# Altium footprint library ref-packages.PCBLIB: 1543 footprints (part 64 of 103)
Each footprint in its own frame and in the unit in brackets; x right, y up, seen from the top. Pads: shape width x height; smd on the part's side, far side on the other; paste and mask are expansions set on the pad; w line width, h text height; cw(c..) or ccw(c..) is an arc to the next point about the centre after c.
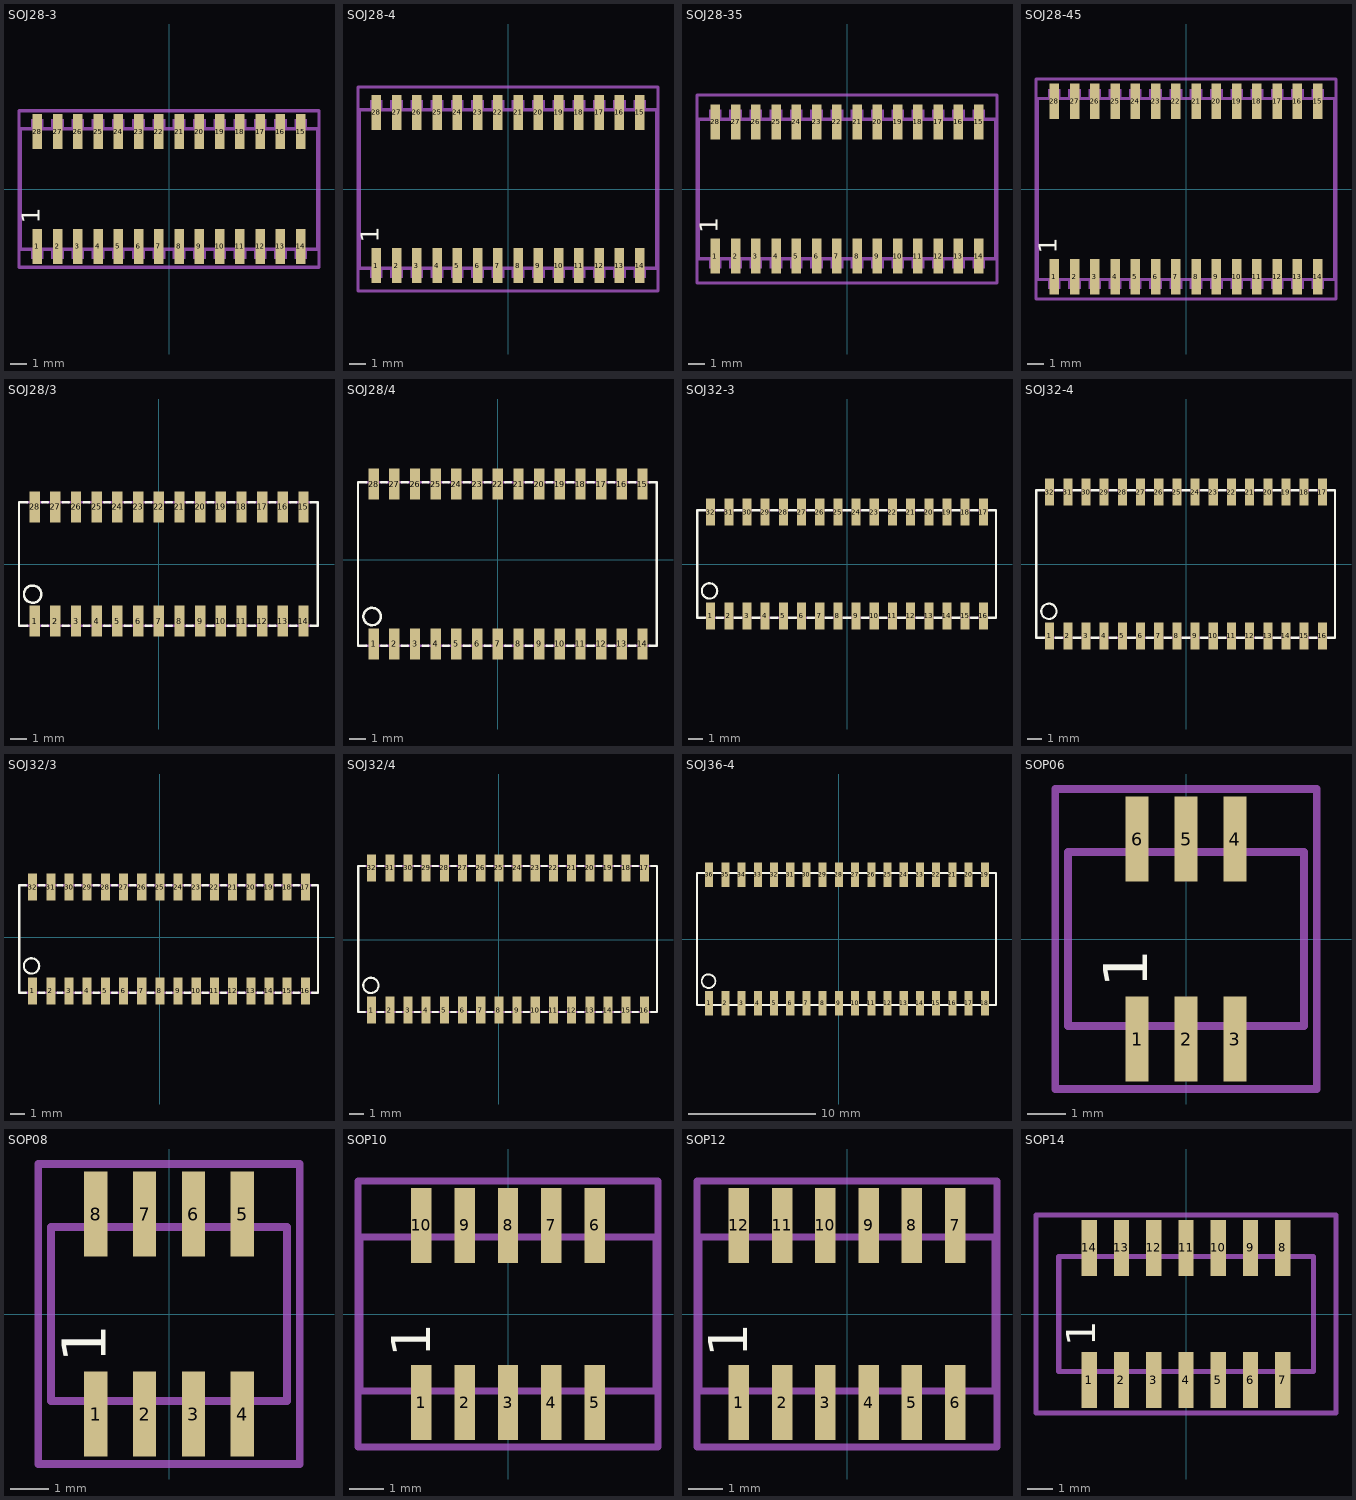
[diagram p63: the footprints below, top view; thin cyan lines are the x and y axes]

## SOJ28-3 [mil]
pads (28):
  rect 23.62x86.61 smd: 1(-325,-141.73) 2(-275,-141.73) 3(-225,-141.73) 4(-175,-141.73) 5(-125,-141.73) 6(-75,-141.73) 7(-25,-141.73) 8(25,-141.73) 9(75,-141.73) 10(125,-141.73) 11(175,-141.73) 12(225,-141.73) 13(275,-141.73) 14(325,-141.73) 15(325,141.73) 16(275,141.73) 17(225,141.73) 18(175,141.73) 19(125,141.73) 20(75,141.73) 21(25,141.73) 22(-25,141.73) 23(-75,141.73) 24(-125,141.73) 25(-175,141.73) 26(-225,141.73) 27(-275,141.73) 28(-325,141.73)
Top Overlay:
  text "1" at -303.54,-85.43 h77.5
Mechanical 16:
  rectangle: -334.84,-144.49 -315.16,-99.61
  rectangle: -340.75,-172.44 -309.25,-152.36
  rectangle: -284.84,-144.49 -265.16,-99.61
  rectangle: -290.75,-172.44 -259.25,-152.36
  rectangle: -234.84,-144.49 -215.16,-99.61
  rectangle: -240.75,-172.44 -209.25,-152.36
  rectangle: -184.84,-144.49 -165.16,-99.61
  rectangle: -190.75,-172.44 -159.25,-152.36
  rectangle: -134.84,-144.49 -115.16,-99.61
  rectangle: -140.75,-172.44 -109.25,-152.36
  rectangle: -84.84,-144.49 -65.16,-99.61
  rectangle: -90.75,-172.44 -59.25,-152.36
  rectangle: -34.84,-144.49 -15.16,-99.61
  rectangle: -40.75,-172.44 -9.25,-152.36
  rectangle: 15.16,-144.49 34.84,-99.61
  rectangle: 9.25,-172.44 40.75,-152.36
  rectangle: 65.16,-144.49 84.84,-99.61
  rectangle: 59.25,-172.44 90.75,-152.36
  rectangle: 115.16,-144.49 134.84,-99.61
  rectangle: 109.25,-172.44 140.75,-152.36
  rectangle: 165.16,-144.49 184.84,-99.61
  rectangle: 159.25,-172.44 190.75,-152.36
  rectangle: 215.16,-144.49 234.84,-99.61
  rectangle: 209.25,-172.44 240.75,-152.36
  rectangle: 265.16,-144.49 284.84,-99.61
  rectangle: 259.25,-172.44 290.75,-152.36
  rectangle: 315.16,-144.49 334.84,-99.61
  rectangle: 309.25,-172.44 340.75,-152.36
  rectangle: 315.16,99.61 334.84,144.49
  rectangle: 309.25,152.36 340.75,172.44
  rectangle: 265.16,99.61 284.84,144.49
  rectangle: 259.25,152.36 290.75,172.44
  rectangle: 215.16,99.61 234.84,144.49
  rectangle: 209.25,152.36 240.75,172.44
  rectangle: 165.16,99.61 184.84,144.49
  rectangle: 159.25,152.36 190.75,172.44
  rectangle: 115.16,99.61 134.84,144.49
  rectangle: 109.25,152.36 140.75,172.44
  rectangle: 65.16,99.61 84.84,144.49
  rectangle: 59.25,152.36 90.75,172.44
  rectangle: 15.16,99.61 34.84,144.49
  rectangle: 9.25,152.36 40.75,172.44
  rectangle: -34.84,99.61 -15.16,144.49
  rectangle: -40.75,152.36 -9.25,172.44
  rectangle: -84.84,99.61 -65.16,144.49
  rectangle: -90.75,152.36 -59.25,172.44
  rectangle: -134.84,99.61 -115.16,144.49
  rectangle: -140.75,152.36 -109.25,172.44
  rectangle: -184.84,99.61 -165.16,144.49
  rectangle: -190.75,152.36 -159.25,172.44
  rectangle: -234.84,99.61 -215.16,144.49
  rectangle: -240.75,152.36 -209.25,172.44
  rectangle: -284.84,99.61 -265.16,144.49
  rectangle: -290.75,152.36 -259.25,172.44
  rectangle: -334.84,99.61 -315.16,144.49
  rectangle: -340.75,152.36 -309.25,172.44
  lines w8: -366.93,-148.43 366.54,-148.43 366.54,148.43 -366.93,148.43 -366.93,-148.43
Mechanical 27:
  lines w7.87: -370.08,-192.91 -370.08,192.91 370.08,192.91 370.08,-192.91 -370.08,-192.91

## SOJ28-4 [mil]
pads (28):
  rect 23.62x86.61 smd: 1(-325,-188.98) 2(-275,-188.98) 3(-225,-188.98) 4(-175,-188.98) 5(-125,-188.98) 6(-75,-188.98) 7(-25,-188.98) 8(25,-188.98) 9(75,-188.98) 10(125,-188.98) 11(175,-188.98) 12(225,-188.98) 13(275,-188.98) 14(325,-188.98) 15(325,188.98) 16(275,188.98) 17(225,188.98) 18(175,188.98) 19(125,188.98) 20(75,188.98) 21(25,188.98) 22(-25,188.98) 23(-75,188.98) 24(-125,188.98) 25(-175,188.98) 26(-225,188.98) 27(-275,188.98) 28(-325,188.98)
Top Overlay:
  text "1" at -303.54,-132.68 h77.5
Mechanical 16:
  rectangle: -334.84,-191.73 -315.16,-146.85
  rectangle: -340.75,-219.69 -309.25,-199.61
  rectangle: -284.84,-191.73 -265.16,-146.85
  rectangle: -290.75,-219.69 -259.25,-199.61
  rectangle: -234.84,-191.73 -215.16,-146.85
  rectangle: -240.75,-219.69 -209.25,-199.61
  rectangle: -184.84,-191.73 -165.16,-146.85
  rectangle: -190.75,-219.69 -159.25,-199.61
  rectangle: -134.84,-191.73 -115.16,-146.85
  rectangle: -140.75,-219.69 -109.25,-199.61
  rectangle: -84.84,-191.73 -65.16,-146.85
  rectangle: -90.75,-219.69 -59.25,-199.61
  rectangle: -34.84,-191.73 -15.16,-146.85
  rectangle: -40.75,-219.69 -9.25,-199.61
  rectangle: 15.16,-191.73 34.84,-146.85
  rectangle: 9.25,-219.69 40.75,-199.61
  rectangle: 65.16,-191.73 84.84,-146.85
  rectangle: 59.25,-219.69 90.75,-199.61
  rectangle: 115.16,-191.73 134.84,-146.85
  rectangle: 109.25,-219.69 140.75,-199.61
  rectangle: 165.16,-191.73 184.84,-146.85
  rectangle: 159.25,-219.69 190.75,-199.61
  rectangle: 215.16,-191.73 234.84,-146.85
  rectangle: 209.25,-219.69 240.75,-199.61
  rectangle: 265.16,-191.73 284.84,-146.85
  rectangle: 259.25,-219.69 290.75,-199.61
  rectangle: 315.16,-191.73 334.84,-146.85
  rectangle: 309.25,-219.69 340.75,-199.61
  rectangle: 315.16,146.85 334.84,191.73
  rectangle: 309.25,199.61 340.75,219.69
  rectangle: 265.16,146.85 284.84,191.73
  rectangle: 259.25,199.61 290.75,219.69
  rectangle: 215.16,146.85 234.84,191.73
  rectangle: 209.25,199.61 240.75,219.69
  rectangle: 165.16,146.85 184.84,191.73
  rectangle: 159.25,199.61 190.75,219.69
  rectangle: 115.16,146.85 134.84,191.73
  rectangle: 109.25,199.61 140.75,219.69
  rectangle: 65.16,146.85 84.84,191.73
  rectangle: 59.25,199.61 90.75,219.69
  rectangle: 15.16,146.85 34.84,191.73
  rectangle: 9.25,199.61 40.75,219.69
  rectangle: -34.84,146.85 -15.16,191.73
  rectangle: -40.75,199.61 -9.25,219.69
  rectangle: -84.84,146.85 -65.16,191.73
  rectangle: -90.75,199.61 -59.25,219.69
  rectangle: -134.84,146.85 -115.16,191.73
  rectangle: -140.75,199.61 -109.25,219.69
  rectangle: -184.84,146.85 -165.16,191.73
  rectangle: -190.75,199.61 -159.25,219.69
  rectangle: -234.84,146.85 -215.16,191.73
  rectangle: -240.75,199.61 -209.25,219.69
  rectangle: -284.84,146.85 -265.16,191.73
  rectangle: -290.75,199.61 -259.25,219.69
  rectangle: -334.84,146.85 -315.16,191.73
  rectangle: -340.75,199.61 -309.25,219.69
  lines w8: -366.93,-195.67 366.54,-195.67 366.54,195.67 -366.93,195.67 -366.93,-195.67
Mechanical 27:
  lines w7.87: -370.08,-251.97 -370.08,251.97 370.08,251.97 370.08,-251.97 -370.08,-251.97

## SOJ28-35 [mil]
pads (28):
  rect 23.62x86.61 smd: 1(-325,-165.35) 2(-275,-165.35) 3(-225,-165.35) 4(-175,-165.35) 5(-125,-165.35) 6(-75,-165.35) 7(-25,-165.35) 8(25,-165.35) 9(75,-165.35) 10(125,-165.35) 11(175,-165.35) 12(225,-165.35) 13(275,-165.35) 14(325,-165.35) 15(325,165.35) 16(275,165.35) 17(225,165.35) 18(175,165.35) 19(125,165.35) 20(75,165.35) 21(25,165.35) 22(-25,165.35) 23(-75,165.35) 24(-125,165.35) 25(-175,165.35) 26(-225,165.35) 27(-275,165.35) 28(-325,165.35)
Top Overlay:
  text "1" at -303.54,-109.06 h77.5
Mechanical 16:
  rectangle: -334.84,-168.11 -315.16,-123.23
  rectangle: -340.75,-196.06 -309.25,-175.98
  rectangle: -284.84,-168.11 -265.16,-123.23
  rectangle: -290.75,-196.06 -259.25,-175.98
  rectangle: -234.84,-168.11 -215.16,-123.23
  rectangle: -240.75,-196.06 -209.25,-175.98
  rectangle: -184.84,-168.11 -165.16,-123.23
  rectangle: -190.75,-196.06 -159.25,-175.98
  rectangle: -134.84,-168.11 -115.16,-123.23
  rectangle: -140.75,-196.06 -109.25,-175.98
  rectangle: -84.84,-168.11 -65.16,-123.23
  rectangle: -90.75,-196.06 -59.25,-175.98
  rectangle: -34.84,-168.11 -15.16,-123.23
  rectangle: -40.75,-196.06 -9.25,-175.98
  rectangle: 15.16,-168.11 34.84,-123.23
  rectangle: 9.25,-196.06 40.75,-175.98
  rectangle: 65.16,-168.11 84.84,-123.23
  rectangle: 59.25,-196.06 90.75,-175.98
  rectangle: 115.16,-168.11 134.84,-123.23
  rectangle: 109.25,-196.06 140.75,-175.98
  rectangle: 165.16,-168.11 184.84,-123.23
  rectangle: 159.25,-196.06 190.75,-175.98
  rectangle: 215.16,-168.11 234.84,-123.23
  rectangle: 209.25,-196.06 240.75,-175.98
  rectangle: 265.16,-168.11 284.84,-123.23
  rectangle: 259.25,-196.06 290.75,-175.98
  rectangle: 315.16,-168.11 334.84,-123.23
  rectangle: 309.25,-196.06 340.75,-175.98
  rectangle: 315.16,123.23 334.84,168.11
  rectangle: 309.25,175.98 340.75,196.06
  rectangle: 265.16,123.23 284.84,168.11
  rectangle: 259.25,175.98 290.75,196.06
  rectangle: 215.16,123.23 234.84,168.11
  rectangle: 209.25,175.98 240.75,196.06
  rectangle: 165.16,123.23 184.84,168.11
  rectangle: 159.25,175.98 190.75,196.06
  rectangle: 115.16,123.23 134.84,168.11
  rectangle: 109.25,175.98 140.75,196.06
  rectangle: 65.16,123.23 84.84,168.11
  rectangle: 59.25,175.98 90.75,196.06
  rectangle: 15.16,123.23 34.84,168.11
  rectangle: 9.25,175.98 40.75,196.06
  rectangle: -34.84,123.23 -15.16,168.11
  rectangle: -40.75,175.98 -9.25,196.06
  rectangle: -84.84,123.23 -65.16,168.11
  rectangle: -90.75,175.98 -59.25,196.06
  rectangle: -134.84,123.23 -115.16,168.11
  rectangle: -140.75,175.98 -109.25,196.06
  rectangle: -184.84,123.23 -165.16,168.11
  rectangle: -190.75,175.98 -159.25,196.06
  rectangle: -234.84,123.23 -215.16,168.11
  rectangle: -240.75,175.98 -209.25,196.06
  rectangle: -284.84,123.23 -265.16,168.11
  rectangle: -290.75,175.98 -259.25,196.06
  rectangle: -334.84,123.23 -315.16,168.11
  rectangle: -340.75,175.98 -309.25,196.06
  lines w8: -366.93,-172.05 366.54,-172.05 366.54,172.05 -366.93,172.05 -366.93,-172.05
Mechanical 27:
  lines w7.87: -370.08,-232.28 -370.08,232.28 370.08,232.28 370.08,-232.28 -370.08,-232.28

## SOJ28-45 [mil]
pads (28):
  rect 23.62x86.61 smd: 1(-325,-216.54) 2(-275,-216.54) 3(-225,-216.54) 4(-175,-216.54) 5(-125,-216.54) 6(-75,-216.54) 7(-25,-216.54) 8(25,-216.54) 9(75,-216.54) 10(125,-216.54) 11(175,-216.54) 12(225,-216.54) 13(275,-216.54) 14(325,-216.54) 15(325,216.54) 16(275,216.54) 17(225,216.54) 18(175,216.54) 19(125,216.54) 20(75,216.54) 21(25,216.54) 22(-25,216.54) 23(-75,216.54) 24(-125,216.54) 25(-175,216.54) 26(-225,216.54) 27(-275,216.54) 28(-325,216.54)
Top Overlay:
  text "1" at -303.54,-160.24 h77.5
Mechanical 16:
  rectangle: -334.84,-219.29 -315.16,-174.41
  rectangle: -340.75,-247.24 -309.25,-227.17
  rectangle: -284.84,-219.29 -265.16,-174.41
  rectangle: -290.75,-247.24 -259.25,-227.17
  rectangle: -234.84,-219.29 -215.16,-174.41
  rectangle: -240.75,-247.24 -209.25,-227.17
  rectangle: -184.84,-219.29 -165.16,-174.41
  rectangle: -190.75,-247.24 -159.25,-227.17
  rectangle: -134.84,-219.29 -115.16,-174.41
  rectangle: -140.75,-247.24 -109.25,-227.17
  rectangle: -84.84,-219.29 -65.16,-174.41
  rectangle: -90.75,-247.24 -59.25,-227.17
  rectangle: -34.84,-219.29 -15.16,-174.41
  rectangle: -40.75,-247.24 -9.25,-227.17
  rectangle: 15.16,-219.29 34.84,-174.41
  rectangle: 9.25,-247.24 40.75,-227.17
  rectangle: 65.16,-219.29 84.84,-174.41
  rectangle: 59.25,-247.24 90.75,-227.17
  rectangle: 115.16,-219.29 134.84,-174.41
  rectangle: 109.25,-247.24 140.75,-227.17
  rectangle: 165.16,-219.29 184.84,-174.41
  rectangle: 159.25,-247.24 190.75,-227.17
  rectangle: 215.16,-219.29 234.84,-174.41
  rectangle: 209.25,-247.24 240.75,-227.17
  rectangle: 265.16,-219.29 284.84,-174.41
  rectangle: 259.25,-247.24 290.75,-227.17
  rectangle: 315.16,-219.29 334.84,-174.41
  rectangle: 309.25,-247.24 340.75,-227.17
  rectangle: 315.16,174.41 334.84,219.29
  rectangle: 309.25,227.17 340.75,247.24
  rectangle: 265.16,174.41 284.84,219.29
  rectangle: 259.25,227.17 290.75,247.24
  rectangle: 215.16,174.41 234.84,219.29
  rectangle: 209.25,227.17 240.75,247.24
  rectangle: 165.16,174.41 184.84,219.29
  rectangle: 159.25,227.17 190.75,247.24
  rectangle: 115.16,174.41 134.84,219.29
  rectangle: 109.25,227.17 140.75,247.24
  rectangle: 65.16,174.41 84.84,219.29
  rectangle: 59.25,227.17 90.75,247.24
  rectangle: 15.16,174.41 34.84,219.29
  rectangle: 9.25,227.17 40.75,247.24
  rectangle: -34.84,174.41 -15.16,219.29
  rectangle: -40.75,227.17 -9.25,247.24
  rectangle: -84.84,174.41 -65.16,219.29
  rectangle: -90.75,227.17 -59.25,247.24
  rectangle: -134.84,174.41 -115.16,219.29
  rectangle: -140.75,227.17 -109.25,247.24
  rectangle: -184.84,174.41 -165.16,219.29
  rectangle: -190.75,227.17 -159.25,247.24
  rectangle: -234.84,174.41 -215.16,219.29
  rectangle: -240.75,227.17 -209.25,247.24
  rectangle: -284.84,174.41 -265.16,219.29
  rectangle: -290.75,227.17 -259.25,247.24
  rectangle: -334.84,174.41 -315.16,219.29
  rectangle: -340.75,227.17 -309.25,247.24
  lines w8: -366.93,-223.23 366.54,-223.23 366.54,223.23 -366.93,223.23 -366.93,-223.23
Mechanical 27:
  lines w7.87: -370.08,-271.65 -370.08,271.65 370.08,271.65 370.08,-271.65 -370.08,-271.65

## SOJ28/3 [mil]
pads (28):
  rect 25x75 smd: 1(-300,-138) 2(-250,-138) 3(-200,-138) 4(-150,-138) 5(-100,-138) 6(-50,-138) 7(0,-138) 8(50,-138) 9(100,-138) 10(150,-138) 11(200,-138) 12(250,-138) 13(300,-138) 14(350,-138) 15(350,138) 16(300,138) 17(250,138) 18(200,138) 19(150,138) 20(100,138) 21(50,138) 22(0,138) 23(-50,138) 24(-100,138) 25(-150,138) 26(-200,138) 27(-250,138) 28(-300,138)
Top Overlay:
  circle w6: c-305,-73 r21
  lines w6: -318,-149 -338,-149 -338,149 -318,149 ; -282,-149 -268,-149 ; -282,149 -268,149 ; -232,-149 -218,-149 ; -232,149 -218,149 ; -182,-149 -168,-149 ; -182,149 -168,149 ; -132,-149 -118,-149 ; -132,149 -118,149 ; -82,-149 -68,-149 ; -82,149 -68,149 ; -32,-149 -18,-149 ; -32,149 -18,149 ; 18,-149 32,-149 ; 18,149 32,149 ; 68,-149 82,-149 ; 68,149 82,149 ; 118,-149 132,-149 ; 118,149 132,149 ; 168,-149 182,-149 ; 168,149 182,149 ; 218,-149 232,-149 ; 218,149 232,149 ; 268,-149 282,-149 ; 268,149 282,149 ; 318,-149 332,-149 ; 318,149 332,149 ; 368,-149 384,-149 384,149 368,149
Mechanical 16:
  rectangle: 340,151 360,171
  rectangle: 343,121 357,151
  rectangle: 340,-171 360,-151
  rectangle: 343,-151 357,-121
  rectangle: 290,-171 310,-151
  rectangle: 293,-151 307,-121
  rectangle: 240,-171 260,-151
  rectangle: 243,-151 257,-121
  rectangle: 190,-171 210,-151
  rectangle: 193,-151 207,-121
  rectangle: 140,-171 160,-151
  rectangle: 143,-151 157,-121
  rectangle: 90,-171 110,-151
  rectangle: 93,-151 107,-121
  rectangle: 40,-171 60,-151
  rectangle: 43,-151 57,-121
  rectangle: -10,-171 10,-151
  rectangle: -7,-151 7,-121
  rectangle: -60,-171 -40,-151
  rectangle: -57,-151 -43,-121
  rectangle: -110,-171 -90,-151
  rectangle: -107,-151 -93,-121
  rectangle: -160,-171 -140,-151
  rectangle: -157,-151 -143,-121
  rectangle: -210,-171 -190,-151
  rectangle: -207,-151 -193,-121
  rectangle: -260,-171 -240,-151
  rectangle: -257,-151 -243,-121
  rectangle: -310,-171 -290,-151
  rectangle: -307,-151 -293,-121
  rectangle: -310,151 -290,171
  rectangle: -307,121 -293,151
  rectangle: -260,151 -240,171
  rectangle: -257,121 -243,151
  rectangle: -210,151 -190,171
  rectangle: -207,121 -193,151
  rectangle: -160,151 -140,171
  rectangle: -157,121 -143,151
  rectangle: -110,151 -90,171
  rectangle: -107,121 -93,151
  rectangle: -60,151 -40,171
  rectangle: -57,121 -43,151
  rectangle: -10,151 10,171
  rectangle: -7,121 7,151
  rectangle: 40,151 60,171
  rectangle: 43,121 57,151
  rectangle: 90,151 110,171
  rectangle: 93,121 107,151
  rectangle: 140,151 160,171
  rectangle: 143,121 157,151
  rectangle: 190,151 210,171
  rectangle: 193,121 207,151
  rectangle: 240,151 260,171
  rectangle: 243,121 257,151
  rectangle: 290,151 310,171
  rectangle: 293,121 307,151
  lines w6: -318,-149 -282,-149 ; -318,149 -282,149 ; -268,-149 -232,-149 ; -268,149 -232,149 ; -218,-149 -182,-149 ; -218,149 -182,149 ; -168,-149 -132,-149 ; -168,149 -132,149 ; -118,-149 -82,-149 ; -118,149 -82,149 ; -68,-149 -32,-149 ; -68,149 -32,149 ; -18,-149 18,-149 ; -18,149 18,149 ; 32,-149 68,-149 ; 32,149 68,149 ; 82,-149 118,-149 ; 82,149 118,149 ; 132,-149 168,-149 ; 132,149 168,149 ; 182,-149 218,-149 ; 182,149 218,149 ; 232,-149 268,-149 ; 232,149 268,149 ; 282,-149 318,-149 ; 282,149 318,149 ; 332,-149 368,-149 ; 332,149 368,149

## SOJ28/4 [mil]
pads (28):
  rect 25x75 smd: 1(-300,-203) 2(-250,-203) 3(-200,-203) 4(-150,-203) 5(-100,-203) 6(-50,-203) 7(0,-203) 8(50,-203) 9(100,-203) 10(150,-203) 11(200,-203) 12(250,-203) 13(300,-203) 14(350,-203) 15(350,183) 16(300,183) 17(250,183) 18(200,183) 19(150,183) 20(100,183) 21(50,183) 22(0,183) 23(-50,183) 24(-100,183) 25(-150,183) 26(-200,183) 27(-250,183) 28(-300,183)
Top Overlay:
  circle w6: c-304,-137 r21
  lines w6: -318,-208 -338,-208 -338,188 -318,188 ; -282,-208 -268,-208 ; -282,188 -268,188 ; -232,-208 -218,-208 ; -232,188 -218,188 ; -182,-208 -168,-208 ; -182,188 -168,188 ; -132,-208 -118,-208 ; -132,188 -118,188 ; -82,-208 -68,-208 ; -82,188 -68,188 ; -32,-208 -18,-208 ; -32,188 -18,188 ; 18,-208 32,-208 ; 18,188 32,188 ; 68,-208 82,-208 ; 68,188 82,188 ; 118,-208 132,-208 ; 118,188 132,188 ; 168,-208 182,-208 ; 168,188 182,188 ; 218,-208 232,-208 ; 218,188 232,188 ; 268,-208 282,-208 ; 268,188 282,188 ; 318,-208 332,-208 ; 318,188 332,188 ; 368,-208 384,-208 384,188 368,188
Mechanical 16:
  rectangle: 340,190 360,210
  rectangle: 343,160 357,190
  rectangle: 340,-230 360,-210
  rectangle: 343,-210 357,-180
  rectangle: 290,190 310,210
  rectangle: 293,160 307,190
  rectangle: 240,190 260,210
  rectangle: 243,160 257,190
  rectangle: 190,190 210,210
  rectangle: 193,160 207,190
  rectangle: 140,190 160,210
  rectangle: 143,160 157,190
  rectangle: 90,190 110,210
  rectangle: 93,160 107,190
  rectangle: 40,190 60,210
  rectangle: 43,160 57,190
  rectangle: -10,190 10,210
  rectangle: -7,160 7,190
  rectangle: -160,190 -140,210
  rectangle: -157,160 -143,190
  rectangle: -110,190 -90,210
  rectangle: -107,160 -93,190
  rectangle: -60,190 -40,210
  rectangle: -57,160 -43,190
  rectangle: -210,190 -190,210
  rectangle: -207,160 -193,190
  rectangle: -260,190 -240,210
  rectangle: -257,160 -243,190
  rectangle: -310,190 -290,210
  rectangle: -307,160 -293,190
  rectangle: -310,-230 -290,-210
  rectangle: -307,-210 -293,-180
  rectangle: -260,-230 -240,-210
  rectangle: -257,-210 -243,-180
  rectangle: -210,-230 -190,-210
  rectangle: -207,-210 -193,-180
  rectangle: -160,-230 -140,-210
  rectangle: -157,-210 -143,-180
  rectangle: -110,-230 -90,-210
  rectangle: -107,-210 -93,-180
  rectangle: -60,-230 -40,-210
  rectangle: -57,-210 -43,-180
  rectangle: -10,-230 10,-210
  rectangle: -7,-210 7,-180
  rectangle: 40,-230 60,-210
  rectangle: 43,-210 57,-180
  rectangle: 90,-230 110,-210
  rectangle: 93,-210 107,-180
  rectangle: 140,-230 160,-210
  rectangle: 143,-210 157,-180
  rectangle: 190,-230 210,-210
  rectangle: 193,-210 207,-180
  rectangle: 240,-230 260,-210
  rectangle: 243,-210 257,-180
  rectangle: 290,-230 310,-210
  rectangle: 293,-210 307,-180
  lines w6: -318,-208 -282,-208 ; -318,188 -282,188 ; -268,-208 -232,-208 ; -268,188 -232,188 ; -218,-208 -182,-208 ; -218,188 -182,188 ; -168,-208 -132,-208 ; -168,188 -132,188 ; -118,-208 -82,-208 ; -118,188 -82,188 ; -68,-208 -32,-208 ; -68,188 -32,188 ; -18,-208 18,-208 ; -18,188 18,188 ; 32,-208 68,-208 ; 32,188 68,188 ; 82,-208 118,-208 ; 82,188 118,188 ; 132,-208 168,-208 ; 132,188 168,188 ; 182,-208 218,-208 ; 182,188 218,188 ; 232,-208 268,-208 ; 232,188 268,188 ; 282,-208 318,-208 ; 282,188 318,188 ; 332,-208 368,-208 ; 332,188 368,188

## SOJ32-3 [mil]
pads (32):
  rect 25x75 smd: 1(-375,-143) 2(-325,-143) 3(-275,-143) 4(-225,-143) 5(-175,-143) 6(-125,-143) 7(-75,-143) 8(-25,-143) 9(25,-143) 10(75,-143) 11(125,-143) 12(175,-143) 13(225,-143) 14(275,-143) 15(325,-143) 16(375,-143) 17(375,143) 18(325,143) 19(275,143) 20(225,143) 21(175,143) 22(125,143) 23(75,143) 24(25,143) 25(-25,143) 26(-75,143) 27(-125,143) 28(-175,143) 29(-225,143) 30(-275,143) 31(-325,143) 32(-375,143)
Top Overlay:
  circle w6: c-378,-74 r21
  lines w6: -391,-148 -412,-148 -412,148 -391,148 ; -359,-148 -341,-148 ; -359,148 -341,148 ; -309,-148 -291,-148 ; -309,148 -291,148 ; -259,-148 -241,-148 ; -259,148 -241,148 ; -209,-148 -191,-148 ; -209,148 -191,148 ; -159,-148 -141,-148 ; -159,148 -141,148 ; -109,-148 -91,-148 ; -109,148 -91,148 ; -59,-148 -41,-148 ; -59,148 -41,148 ; -9,-148 9,-148 ; -9,148 9,148 ; 41,-148 59,-148 ; 41,148 59,148 ; 91,-148 109,-148 ; 91,148 109,148 ; 141,-148 159,-148 ; 141,148 159,148 ; 191,-148 209,-148 ; 191,148 209,148 ; 241,-148 259,-148 ; 241,148 259,148 ; 291,-148 309,-148 ; 291,148 309,148 ; 341,-148 359,-148 ; 341,148 359,148 ; 391,-148 410,-148 410,148 391,148
Mechanical 16:
  rectangle: 365,150 385,170
  rectangle: 368,120 382,150
  rectangle: 365,-170 385,-150
  rectangle: 368,-150 382,-120
  rectangle: 315,150 335,170
  rectangle: 318,120 332,150
  rectangle: 265,150 285,170
  rectangle: 268,120 282,150
  rectangle: 215,150 235,170
  rectangle: 218,120 232,150
  rectangle: 165,150 185,170
  rectangle: 168,120 182,150
  rectangle: 115,150 135,170
  rectangle: 118,120 132,150
  rectangle: 65,150 85,170
  rectangle: 68,120 82,150
  rectangle: 15,150 35,170
  rectangle: 18,120 32,150
  rectangle: -35,150 -15,170
  rectangle: -32,120 -18,150
  rectangle: -85,150 -65,170
  rectangle: -82,120 -68,150
  rectangle: -135,150 -115,170
  rectangle: -132,120 -118,150
  rectangle: -185,150 -165,170
  rectangle: -182,120 -168,150
  rectangle: -385,150 -365,170
  rectangle: -382,120 -368,150
  rectangle: -335,150 -315,170
  rectangle: -332,120 -318,150
  rectangle: -285,150 -265,170
  rectangle: -282,120 -268,150
  rectangle: -235,150 -215,170
  rectangle: -232,120 -218,150
  rectangle: -385,-170 -365,-150
  rectangle: -382,-150 -368,-120
  rectangle: -335,-170 -315,-150
  rectangle: -332,-150 -318,-120
  rectangle: -285,-170 -265,-150
  rectangle: -282,-150 -268,-120
  rectangle: -235,-170 -215,-150
  rectangle: -232,-150 -218,-120
  rectangle: -185,-170 -165,-150
  rectangle: -182,-150 -168,-120
  rectangle: -135,-170 -115,-150
  rectangle: -132,-150 -118,-120
  rectangle: -85,-170 -65,-150
  rectangle: -82,-150 -68,-120
  rectangle: -35,-170 -15,-150
  rectangle: -32,-150 -18,-120
  rectangle: 15,-170 35,-150
  rectangle: 18,-150 32,-120
  rectangle: 65,-170 85,-150
  rectangle: 68,-150 82,-120
  rectangle: 115,-170 135,-150
  rectangle: 118,-150 132,-120
  rectangle: 165,-170 185,-150
  rectangle: 168,-150 182,-120
  rectangle: 215,-170 235,-150
  rectangle: 218,-150 232,-120
  rectangle: 265,-170 285,-150
  rectangle: 268,-150 282,-120
  rectangle: 315,-170 335,-150
  rectangle: 318,-150 332,-120
  lines w6: -389,-148 -361,-148 ; -389,148 -361,148 ; -339,-148 -311,-148 ; -339,148 -311,148 ; -289,-148 -261,-148 ; -289,148 -261,148 ; -239,-148 -211,-148 ; -239,148 -211,148 ; -189,-148 -161,-148 ; -189,148 -161,148 ; -139,-148 -111,-148 ; -139,148 -111,148 ; -89,-148 -61,-148 ; -89,148 -61,148 ; -39,-148 -11,-148 ; -39,148 -11,148 ; 11,-148 39,-148 ; 11,148 39,148 ; 61,-148 89,-148 ; 61,148 89,148 ; 111,-148 139,-148 ; 111,148 139,148 ; 161,-148 189,-148 ; 161,148 189,148 ; 211,-148 239,-148 ; 211,148 239,148 ; 261,-148 289,-148 ; 261,148 289,148 ; 311,-148 339,-148 ; 311,148 339,148 ; 361,-148 389,-148 ; 361,148 389,148

## SOJ32-4 [mil]
pads (32):
  rect 25x75 smd: 1(-375,-198) 2(-325,-198) 3(-275,-198) 4(-225,-198) 5(-175,-198) 6(-125,-198) 7(-75,-198) 8(-25,-198) 9(25,-198) 10(75,-198) 11(125,-198) 12(175,-198) 13(225,-198) 14(275,-198) 15(325,-198) 16(375,-198) 17(375,198) 18(325,198) 19(275,198) 20(225,198) 21(175,198) 22(125,198) 23(75,198) 24(25,198) 25(-25,198) 26(-75,198) 27(-125,198) 28(-175,198) 29(-225,198) 30(-275,198) 31(-325,198) 32(-375,198)
Top Overlay:
  circle w6: c-377,-130 r21
  lines w6: -391,-203 -412,-203 -412,203 -391,203 ; -359,-203 -341,-203 ; -359,203 -341,203 ; -309,-203 -291,-203 ; -309,203 -291,203 ; -259,-203 -241,-203 ; -259,203 -241,203 ; -209,-203 -191,-203 ; -209,203 -191,203 ; -159,-203 -141,-203 ; -159,203 -141,203 ; -109,-203 -91,-203 ; -109,203 -91,203 ; -59,-203 -41,-203 ; -59,203 -41,203 ; -9,-203 9,-203 ; -9,203 9,203 ; 41,-203 59,-203 ; 41,203 59,203 ; 91,-203 109,-203 ; 91,203 109,203 ; 141,-203 159,-203 ; 141,203 159,203 ; 191,-203 209,-203 ; 191,203 209,203 ; 241,-203 259,-203 ; 241,203 259,203 ; 291,-203 309,-203 ; 291,203 309,203 ; 341,-203 359,-203 ; 341,203 359,203 ; 391,-203 410,-203 410,203 391,203
Mechanical 16:
  rectangle: 365,205 385,225
  rectangle: 368,175 382,205
  rectangle: 365,-225 385,-205
  rectangle: 368,-205 382,-175
  rectangle: 315,205 335,225
  rectangle: 318,175 332,205
  rectangle: -35,205 -15,225
  rectangle: -32,175 -18,205
  rectangle: 15,205 35,225
  rectangle: 18,175 32,205
  rectangle: 65,205 85,225
  rectangle: 68,175 82,205
  rectangle: 115,205 135,225
  rectangle: 118,175 132,205
  rectangle: 165,205 185,225
  rectangle: 168,175 182,205
  rectangle: 215,205 235,225
  rectangle: 218,175 232,205
  rectangle: 265,205 285,225
  rectangle: 268,175 282,205
  rectangle: -385,205 -365,225
  rectangle: -382,175 -368,205
  rectangle: -335,205 -315,225
  rectangle: -332,175 -318,205
  rectangle: -285,205 -265,225
  rectangle: -282,175 -268,205
  rectangle: -235,205 -215,225
  rectangle: -232,175 -218,205
  rectangle: -185,205 -165,225
  rectangle: -182,175 -168,205
  rectangle: -135,205 -115,225
  rectangle: -132,175 -118,205
  rectangle: -85,205 -65,225
  rectangle: -82,175 -68,205
  rectangle: -385,-225 -365,-205
  rectangle: -382,-205 -368,-175
  rectangle: -335,-225 -315,-205
  rectangle: -332,-205 -318,-175
  rectangle: -285,-225 -265,-205
  rectangle: -282,-205 -268,-175
  rectangle: -235,-225 -215,-205
  rectangle: -232,-205 -218,-175
  rectangle: -185,-225 -165,-205
  rectangle: -182,-205 -168,-175
  rectangle: -135,-225 -115,-205
  rectangle: -132,-205 -118,-175
  rectangle: -85,-225 -65,-205
  rectangle: -82,-205 -68,-175
  rectangle: -35,-225 -15,-205
  rectangle: -32,-205 -18,-175
  rectangle: 15,-225 35,-205
  rectangle: 18,-205 32,-175
  rectangle: 65,-225 85,-205
  rectangle: 68,-205 82,-175
  rectangle: 115,-225 135,-205
  rectangle: 118,-205 132,-175
  rectangle: 165,-225 185,-205
  rectangle: 168,-205 182,-175
  rectangle: 215,-225 235,-205
  rectangle: 218,-205 232,-175
  rectangle: 265,-225 285,-205
  rectangle: 268,-205 282,-175
  rectangle: 315,-225 335,-205
  rectangle: 318,-205 332,-175
  lines w6: -389,-203 -361,-203 ; -389,203 -361,203 ; -339,-203 -311,-203 ; -339,203 -311,203 ; -289,-203 -261,-203 ; -289,203 -261,203 ; -239,-203 -211,-203 ; -239,203 -211,203 ; -189,-203 -161,-203 ; -189,203 -161,203 ; -139,-203 -111,-203 ; -139,203 -111,203 ; -89,-203 -61,-203 ; -89,203 -61,203 ; -39,-203 -11,-203 ; -39,203 -11,203 ; 11,-203 39,-203 ; 11,203 39,203 ; 61,-203 89,-203 ; 61,203 89,203 ; 111,-203 139,-203 ; 111,203 139,203 ; 161,-203 189,-203 ; 161,203 189,203 ; 211,-203 239,-203 ; 211,203 239,203 ; 261,-203 289,-203 ; 261,203 289,203 ; 311,-203 339,-203 ; 311,203 339,203 ; 361,-203 389,-203 ; 361,203 389,203

## SOJ32/3 [mil]
pads (32):
  rect 25x75 smd: 1(-350,-148) 2(-300,-148) 3(-250,-148) 4(-200,-148) 5(-150,-148) 6(-100,-148) 7(-50,-148) 8(0,-148) 9(50,-148) 10(100,-148) 11(150,-148) 12(200,-148) 13(250,-148) 14(300,-148) 15(350,-148) 16(400,-148) 17(400,138) 18(350,138) 19(300,138) 20(250,138) 21(200,138) 22(150,138) 23(100,138) 24(50,138) 25(0,138) 26(-50,138) 27(-100,138) 28(-150,138) 29(-200,138) 30(-250,138) 31(-300,138) 32(-350,138)
Top Overlay:
  circle w6: c-353,-79 r21
  lines w6: -368,-153 -387,-153 -387,143 -368,143 ; -332,-153 -318,-153 ; -332,143 -318,143 ; -282,-153 -268,-153 ; -282,143 -268,143 ; -232,-153 -218,-153 ; -232,143 -218,143 ; -182,-153 -168,-153 ; -182,143 -168,143 ; -132,-153 -118,-153 ; -132,143 -118,143 ; -82,-153 -68,-153 ; -82,143 -68,143 ; -32,-153 -18,-153 ; -32,143 -18,143 ; 18,-153 32,-153 ; 18,143 32,143 ; 68,-153 82,-153 ; 68,143 82,143 ; 118,-153 132,-153 ; 118,143 132,143 ; 168,-153 182,-153 ; 168,143 182,143 ; 218,-153 232,-153 ; 218,143 232,143 ; 268,-153 282,-153 ; 268,143 282,143 ; 318,-153 332,-153 ; 318,143 332,143 ; 368,-153 382,-153 ; 368,143 382,143 ; 418,-153 435,-153 435,143 418,143
Mechanical 16:
  rectangle: 390,145 410,165
  rectangle: 393,115 407,145
  rectangle: 390,-175 410,-155
  rectangle: 393,-155 407,-125
  rectangle: 340,145 360,165
  rectangle: 343,115 357,145
  rectangle: 290,145 310,165
  rectangle: 293,115 307,145
  rectangle: 240,145 260,165
  rectangle: 243,115 257,145
  rectangle: 190,145 210,165
  rectangle: 193,115 207,145
  rectangle: 140,145 160,165
  rectangle: 143,115 157,145
  rectangle: 90,145 110,165
  rectangle: 93,115 107,145
  rectangle: 40,145 60,165
  rectangle: 43,115 57,145
  rectangle: -10,145 10,165
  rectangle: -7,115 7,145
  rectangle: -60,145 -40,165
  rectangle: -57,115 -43,145
  rectangle: -110,145 -90,165
  rectangle: -107,115 -93,145
  rectangle: -160,145 -140,165
  rectangle: -157,115 -143,145
  rectangle: -360,145 -340,165
  rectangle: -357,115 -343,145
  rectangle: -310,145 -290,165
  rectangle: -307,115 -293,145
  rectangle: -260,145 -240,165
  rectangle: -257,115 -243,145
  rectangle: -210,145 -190,165
  rectangle: -207,115 -193,145
  rectangle: -360,-175 -340,-155
  rectangle: -357,-155 -343,-125
  rectangle: -310,-175 -290,-155
  rectangle: -307,-155 -293,-125
  rectangle: -260,-175 -240,-155
  rectangle: -257,-155 -243,-125
  rectangle: -210,-175 -190,-155
  rectangle: -207,-155 -193,-125
  rectangle: -160,-175 -140,-155
  rectangle: -157,-155 -143,-125
  rectangle: -110,-175 -90,-155
  rectangle: -107,-155 -93,-125
  rectangle: -60,-175 -40,-155
  rectangle: -57,-155 -43,-125
  rectangle: -10,-175 10,-155
  rectangle: -7,-155 7,-125
  rectangle: 40,-175 60,-155
  rectangle: 43,-155 57,-125
  rectangle: 90,-175 110,-155
  rectangle: 93,-155 107,-125
  rectangle: 140,-175 160,-155
  rectangle: 143,-155 157,-125
  rectangle: 190,-175 210,-155
  rectangle: 193,-155 207,-125
  rectangle: 240,-175 260,-155
  rectangle: 243,-155 257,-125
  rectangle: 290,-175 310,-155
  rectangle: 293,-155 307,-125
  rectangle: 340,-175 360,-155
  rectangle: 343,-155 357,-125
  lines w6: -368,-153 -332,-153 ; -368,143 -332,143 ; -318,-153 -282,-153 ; -318,143 -282,143 ; -268,-153 -232,-153 ; -268,143 -232,143 ; -218,-153 -182,-153 ; -218,143 -182,143 ; -168,-153 -132,-153 ; -168,143 -132,143 ; -118,-153 -82,-153 ; -118,143 -82,143 ; -68,-153 -32,-153 ; -68,143 -32,143 ; -18,-153 18,-153 ; -18,143 18,143 ; 32,-153 68,-153 ; 32,143 68,143 ; 82,-153 118,-153 ; 82,143 118,143 ; 132,-153 168,-153 ; 132,143 168,143 ; 182,-153 218,-153 ; 182,143 218,143 ; 232,-153 268,-153 ; 232,143 268,143 ; 282,-153 318,-153 ; 282,143 318,143 ; 332,-153 368,-153 ; 332,143 368,143 ; 382,-153 418,-153 ; 382,143 418,143

## SOJ32/4 [mil]
pads (32):
  rect 25x75 smd: 1(-350,-193) 2(-300,-193) 3(-250,-193) 4(-200,-193) 5(-150,-193) 6(-100,-193) 7(-50,-193) 8(0,-193) 9(50,-193) 10(100,-193) 11(150,-193) 12(200,-193) 13(250,-193) 14(300,-193) 15(350,-193) 16(400,-193) 17(400,198) 18(350,198) 19(300,198) 20(250,198) 21(200,198) 22(150,198) 23(100,198) 24(50,198) 25(0,198) 26(-50,198) 27(-100,198) 28(-150,198) 29(-200,198) 30(-250,198) 31(-300,198) 32(-350,198)
Top Overlay:
  circle w6: c-352,-125 r21
  lines w6: -368,-198 -387,-198 -387,203 -368,203 ; -332,-198 -318,-198 ; -332,203 -318,203 ; -282,-198 -268,-198 ; -282,203 -268,203 ; -232,-198 -218,-198 ; -232,203 -218,203 ; -182,-198 -168,-198 ; -182,203 -168,203 ; -132,-198 -118,-198 ; -132,203 -118,203 ; -82,-198 -68,-198 ; -82,203 -68,203 ; -32,-198 -18,-198 ; -32,203 -18,203 ; 18,-198 32,-198 ; 18,203 32,203 ; 68,-198 82,-198 ; 68,203 82,203 ; 118,-198 132,-198 ; 118,203 132,203 ; 168,-198 182,-198 ; 168,203 182,203 ; 218,-198 232,-198 ; 218,203 232,203 ; 268,-198 282,-198 ; 268,203 282,203 ; 318,-198 332,-198 ; 318,203 332,203 ; 368,-198 382,-198 ; 368,203 382,203 ; 418,-198 435,-198 435,203 418,203
Mechanical 16:
  rectangle: 390,205 410,225
  rectangle: 393,175 407,205
  rectangle: 390,-220 410,-200
  rectangle: 393,-200 407,-170
  rectangle: 340,205 360,225
  rectangle: 343,175 357,205
  rectangle: -10,205 10,225
  rectangle: -7,175 7,205
  rectangle: 40,205 60,225
  rectangle: 43,175 57,205
  rectangle: 90,205 110,225
  rectangle: 93,175 107,205
  rectangle: 140,205 160,225
  rectangle: 143,175 157,205
  rectangle: 190,205 210,225
  rectangle: 193,175 207,205
  rectangle: 240,205 260,225
  rectangle: 243,175 257,205
  rectangle: 290,205 310,225
  rectangle: 293,175 307,205
  rectangle: -360,205 -340,225
  rectangle: -357,175 -343,205
  rectangle: -310,205 -290,225
  rectangle: -307,175 -293,205
  rectangle: -260,205 -240,225
  rectangle: -257,175 -243,205
  rectangle: -210,205 -190,225
  rectangle: -207,175 -193,205
  rectangle: -160,205 -140,225
  rectangle: -157,175 -143,205
  rectangle: -110,205 -90,225
  rectangle: -107,175 -93,205
  rectangle: -60,205 -40,225
  rectangle: -57,175 -43,205
  rectangle: -360,-220 -340,-200
  rectangle: -357,-200 -343,-170
  rectangle: -310,-220 -290,-200
  rectangle: -307,-200 -293,-170
  rectangle: -260,-220 -240,-200
  rectangle: -257,-200 -243,-170
  rectangle: -210,-220 -190,-200
  rectangle: -207,-200 -193,-170
  rectangle: -160,-220 -140,-200
  rectangle: -157,-200 -143,-170
  rectangle: -110,-220 -90,-200
  rectangle: -107,-200 -93,-170
  rectangle: -60,-220 -40,-200
  rectangle: -57,-200 -43,-170
  rectangle: -10,-220 10,-200
  rectangle: -7,-200 7,-170
  rectangle: 40,-220 60,-200
  rectangle: 43,-200 57,-170
  rectangle: 90,-220 110,-200
  rectangle: 93,-200 107,-170
  rectangle: 140,-220 160,-200
  rectangle: 143,-200 157,-170
  rectangle: 190,-220 210,-200
  rectangle: 193,-200 207,-170
  rectangle: 240,-220 260,-200
  rectangle: 243,-200 257,-170
  rectangle: 290,-220 310,-200
  rectangle: 293,-200 307,-170
  rectangle: 340,-220 360,-200
  rectangle: 343,-200 357,-170
  lines w6: -368,-198 -332,-198 ; -368,203 -332,203 ; -318,-198 -282,-198 ; -318,203 -282,203 ; -268,-198 -232,-198 ; -268,203 -232,203 ; -218,-198 -182,-198 ; -218,203 -182,203 ; -168,-198 -132,-198 ; -168,203 -132,203 ; -118,-198 -82,-198 ; -118,203 -82,203 ; -68,-198 -32,-198 ; -68,203 -32,203 ; -18,-198 18,-198 ; -18,203 18,203 ; 32,-198 68,-198 ; 32,203 68,203 ; 82,-198 118,-198 ; 82,203 118,203 ; 132,-198 168,-198 ; 132,203 168,203 ; 182,-198 218,-198 ; 182,203 218,203 ; 232,-198 268,-198 ; 232,203 268,203 ; 282,-198 318,-198 ; 282,203 318,203 ; 332,-198 368,-198 ; 332,203 368,203 ; 382,-198 418,-198 ; 382,203 418,203

## SOJ36-4 [mil]
pads (36):
  rect 25x75 smd: 1(-400,-198) 2(-350,-198) 3(-300,-198) 4(-250,-198) 5(-200,-198) 6(-150,-198) 7(-100,-198) 8(-50,-198) 9(0,-198) 10(50,-198) 11(100,-198) 12(150,-198) 13(200,-198) 14(250,-198) 15(300,-198) 16(350,-198) 17(400,-198) 18(450,-198) 19(450,198) 20(400,198) 21(350,198) 22(300,198) 23(250,198) 24(200,198) 25(150,198) 26(100,198) 27(50,198) 28(0,198) 29(-50,198) 30(-100,198) 31(-150,198) 32(-200,198) 33(-250,198) 34(-300,198) 35(-350,198) 36(-400,198)
Top Overlay:
  circle w6: c-402,-130 r21
  lines w6: -437,-203 -437,203 485,203 485,-203 -437,-203
Mechanical 16:
  rectangle: 390,-225 410,-205
  rectangle: 393,-205 407,-175
  rectangle: 340,-225 360,-205
  rectangle: 343,-205 357,-175
  rectangle: 440,-225 460,-205
  rectangle: 443,-205 457,-175
  rectangle: 140,205 160,225
  rectangle: 143,175 157,205
  rectangle: 190,205 210,225
  rectangle: 193,175 207,205
  rectangle: 240,205 260,225
  rectangle: 243,175 257,205
  rectangle: 290,205 310,225
  rectangle: 293,175 307,205
  rectangle: 340,205 360,225
  rectangle: 343,175 357,205
  rectangle: 390,205 410,225
  rectangle: 393,175 407,205
  rectangle: 440,205 460,225
  rectangle: 443,175 457,205
  rectangle: -210,205 -190,225
  rectangle: -207,175 -193,205
  rectangle: -160,205 -140,225
  rectangle: -157,175 -143,205
  rectangle: -110,205 -90,225
  rectangle: -107,175 -93,205
  rectangle: -60,205 -40,225
  rectangle: -57,175 -43,205
  rectangle: -10,205 10,225
  rectangle: -7,175 7,205
  rectangle: 40,205 60,225
  rectangle: 43,175 57,205
  rectangle: 90,205 110,225
  rectangle: 93,175 107,205
  rectangle: -410,-225 -390,-205
  rectangle: -407,-205 -393,-175
  rectangle: -360,-225 -340,-205
  rectangle: -357,-205 -343,-175
  rectangle: -310,-225 -290,-205
  rectangle: -307,-205 -293,-175
  rectangle: -260,-225 -240,-205
  rectangle: -257,-205 -243,-175
  rectangle: -210,-225 -190,-205
  rectangle: -207,-205 -193,-175
  rectangle: -160,-225 -140,-205
  rectangle: -157,-205 -143,-175
  rectangle: -110,-225 -90,-205
  rectangle: -107,-205 -93,-175
  rectangle: -60,-225 -40,-205
  rectangle: -57,-205 -43,-175
  rectangle: -10,-225 10,-205
  rectangle: -7,-205 7,-175
  rectangle: 40,-225 60,-205
  rectangle: 43,-205 57,-175
  rectangle: 90,-225 110,-205
  rectangle: 93,-205 107,-175
  rectangle: 140,-225 160,-205
  rectangle: 143,-205 157,-175
  rectangle: 190,-225 210,-205
  rectangle: 193,-205 207,-175
  rectangle: 240,-225 260,-205
  rectangle: 243,-205 257,-175
  rectangle: 290,-225 310,-205
  rectangle: 293,-205 307,-175
  rectangle: -260,205 -240,225
  rectangle: -257,175 -243,205
  rectangle: -310,205 -290,225
  rectangle: -307,175 -293,205
  rectangle: -360,205 -340,225
  rectangle: -357,175 -343,205
  rectangle: -410,205 -390,225
  rectangle: -407,175 -393,205
  lines w6: 361,-203 364,-203

## SOP06 [mil]
pads (6):
  rect 23.62x86.61 smd: 1(-50,-102.36) 2(0,-102.36) 3(50,-102.36) 4(50,102.36) 5(0,102.36) 6(-50,102.36)
Top Overlay:
  text "1" at -25,-50 h77.5
Mechanical 16:
  rectangle: -59.84,-137.4 -40.16,-92.91
  rectangle: -9.84,-137.4 9.84,-92.91
  rectangle: 40.16,-137.4 59.84,-92.91
  rectangle: 40.16,92.91 59.84,137.4
  rectangle: -9.84,92.91 9.84,137.4
  rectangle: -59.84,92.91 -40.16,137.4
  lines w8: -120.87,-88.98 120.87,-88.98 120.87,88.98 -120.87,88.98 -120.87,-88.98
Mechanical 27:
  lines w7.87: -133.86,-153.54 -133.86,153.54 133.86,153.54 133.86,-153.54 -133.86,-153.54

## SOP08 [mil]
pads (8):
  rect 23.62x86.61 smd: 1(-75,-102.36) 2(-25,-102.36) 3(25,-102.36) 4(75,-102.36) 5(75,102.36) 6(25,102.36) 7(-25,102.36) 8(-75,102.36)
Top Overlay:
  text "1" at -50,-50 h77.5
Mechanical 16:
  rectangle: -84.84,-137.4 -65.16,-92.91
  rectangle: -34.84,-137.4 -15.16,-92.91
  rectangle: 15.16,-137.4 34.84,-92.91
  rectangle: 65.16,-137.4 84.84,-92.91
  rectangle: 65.16,92.91 84.84,137.4
  rectangle: 15.16,92.91 34.84,137.4
  rectangle: -34.84,92.91 -15.16,137.4
  rectangle: -84.84,92.91 -65.16,137.4
  lines w8: -120.87,-88.98 120.87,-88.98 120.87,88.98 -120.87,88.98 -120.87,-88.98
Mechanical 27:
  lines w7.87: -133.86,-153.54 -133.86,153.54 133.86,153.54 133.86,-153.54 -133.86,-153.54

## SOP10 [mil]
pads (10):
  rect 23.62x86.61 smd: 1(-100,-102.36) 2(-50,-102.36) 3(0,-102.36) 4(50,-102.36) 5(100,-102.36) 6(100,102.36) 7(50,102.36) 8(0,102.36) 9(-50,102.36) 10(-100,102.36)
Top Overlay:
  text "1" at -75,-50 h77.5
Mechanical 16:
  rectangle: -109.84,-137.4 -90.16,-92.91
  rectangle: -59.84,-137.4 -40.16,-92.91
  rectangle: -9.84,-137.4 9.84,-92.91
  rectangle: 40.16,-137.4 59.84,-92.91
  rectangle: 90.16,-137.4 109.84,-92.91
  rectangle: 90.16,92.91 109.84,137.4
  rectangle: 40.16,92.91 59.84,137.4
  rectangle: -9.84,92.91 9.84,137.4
  rectangle: -59.84,92.91 -40.16,137.4
  rectangle: -109.84,92.91 -90.16,137.4
  lines w8: -171.06,-88.98 171.06,-88.98 171.06,88.98 -171.06,88.98 -171.06,-88.98
Mechanical 27:
  lines w7.87: -173.23,-153.54 -173.23,153.54 173.23,153.54 173.23,-153.54 -173.23,-153.54

## SOP12 [mil]
pads (12):
  rect 23.62x86.61 smd: 1(-125,-102.36) 2(-75,-102.36) 3(-25,-102.36) 4(25,-102.36) 5(75,-102.36) 6(125,-102.36) 7(125,102.36) 8(75,102.36) 9(25,102.36) 10(-25,102.36) 11(-75,102.36) 12(-125,102.36)
Top Overlay:
  text "1" at -100,-50 h77.5
Mechanical 16:
  rectangle: -134.84,-137.4 -115.16,-92.91
  rectangle: -84.84,-137.4 -65.16,-92.91
  rectangle: -34.84,-137.4 -15.16,-92.91
  rectangle: 15.16,-137.4 34.84,-92.91
  rectangle: 65.16,-137.4 84.84,-92.91
  rectangle: 115.16,-137.4 134.84,-92.91
  rectangle: 115.16,92.91 134.84,137.4
  rectangle: 65.16,92.91 84.84,137.4
  rectangle: 15.16,92.91 34.84,137.4
  rectangle: -34.84,92.91 -15.16,137.4
  rectangle: -84.84,92.91 -65.16,137.4
  rectangle: -134.84,92.91 -115.16,137.4
  lines w8: -171.06,-88.98 171.06,-88.98 171.06,88.98 -171.06,88.98 -171.06,-88.98
Mechanical 27:
  lines w7.87: -173.23,-153.54 -173.23,153.54 173.23,153.54 173.23,-153.54 -173.23,-153.54

## SOP14 [mil]
pads (14):
  rect 23.62x86.61 smd: 1(-150,-102.36) 2(-100,-102.36) 3(-50,-102.36) 4(0,-102.36) 5(50,-102.36) 6(100,-102.36) 7(150,-102.36) 8(150,102.36) 9(100,102.36) 10(50,102.36) 11(0,102.36) 12(-50,102.36) 13(-100,102.36) 14(-150,102.36)
Top Overlay:
  text "1" at -125,-50 h77.5
Mechanical 16:
  rectangle: -159.84,-137.4 -140.16,-92.91
  rectangle: -109.84,-137.4 -90.16,-92.91
  rectangle: -59.84,-137.4 -40.16,-92.91
  rectangle: -9.84,-137.4 9.84,-92.91
  rectangle: 40.16,-137.4 59.84,-92.91
  rectangle: 90.16,-137.4 109.84,-92.91
  rectangle: 140.16,-137.4 159.84,-92.91
  rectangle: 140.16,92.91 159.84,137.4
  rectangle: 90.16,92.91 109.84,137.4
  rectangle: 40.16,92.91 59.84,137.4
  rectangle: -9.84,92.91 9.84,137.4
  rectangle: -59.84,92.91 -40.16,137.4
  rectangle: -109.84,92.91 -90.16,137.4
  rectangle: -159.84,92.91 -140.16,137.4
  lines w8: -197.05,-88.98 197.44,-88.98 197.44,88.98 -197.05,88.98 -197.05,-88.98
Mechanical 27:
  lines w7.87: -232.28,-153.54 -232.28,153.54 232.28,153.54 232.28,-153.54 -232.28,-153.54